# Altium footprint library adafruit.PCBLIB: 648 footprints (part 36 of 41)
Each footprint in its own frame and in the unit in brackets; x right, y up, seen from the top. Pads: shape width x height; smd on the part's side, far side on the other; paste and mask are expansions set on the pad; w line width, h text height; cw(c..) or ccw(c..) is an arc to the next point about the centre after c.
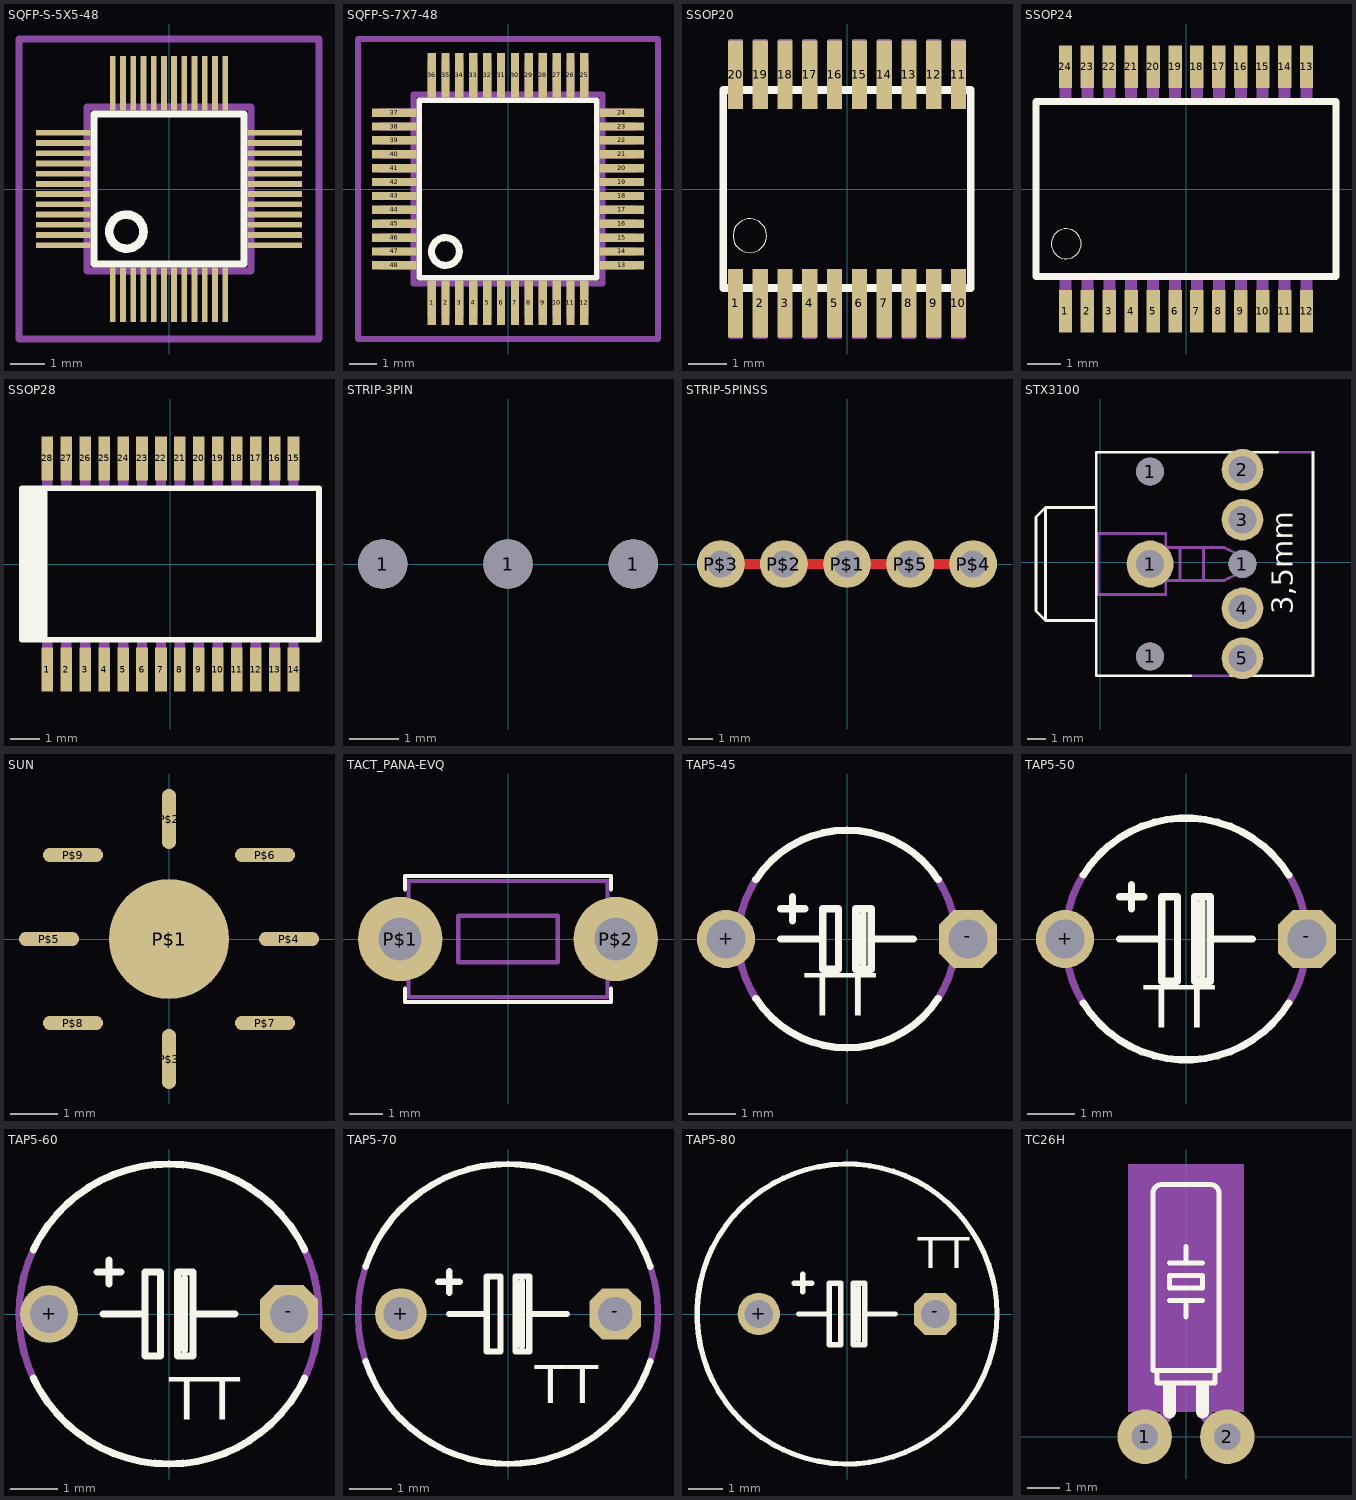
[diagram p35: the footprints below, top view; thin cyan lines are the x and y axes]

## SQFP-S-5X5-48 [mm]
pads (48):
  rect 0.17x1.6 smd: 1(-1.65,-3.1) 2(-1.35,-3.1) 3(-1.05,-3.1) 4(-0.75,-3.1) 5(-0.45,-3.1) 6(-0.15,-3.1) 7(0.15,-3.1) 8(0.45,-3.1) 9(0.75,-3.1) 10(1.05,-3.1) 11(1.35,-3.1) 12(1.65,-3.1) 25(1.65,3.1) 26(1.35,3.1) 27(1.05,3.1) 28(0.75,3.1) 29(0.45,3.1) 30(0.15,3.1) 31(-0.15,3.1) 32(-0.45,3.1) 33(-0.75,3.1) 34(-1.05,3.1) 35(-1.35,3.1) 36(-1.65,3.1)
  rect 1.6x0.17 smd: 13(3.1,-1.65) 14(3.1,-1.35) 15(3.1,-1.05) 16(3.1,-0.75) 17(3.1,-0.45) 18(3.1,-0.15) 19(3.1,0.15) 20(3.1,0.45) 21(3.1,0.75) 22(3.1,1.05) 23(3.1,1.35) 24(3.1,1.65) 37(-3.1,1.65) 38(-3.1,1.35) 39(-3.1,1.05) 40(-3.1,0.75) 41(-3.1,0.45) 42(-3.1,0.15) 43(-3.1,-0.15) 44(-3.1,-0.45) 45(-3.1,-0.75) 46(-3.1,-1.05) 47(-3.1,-1.35) 48(-3.1,-1.65)
Top Overlay:
  circle w0.254: c-1.25,-1.25 r0.5
  lines w0.203: -2.2,-2.2 -2.2,2.2 2.2,2.2 2.2,-2.2 -2.2,-2.2
Mechanical 16:
  rectangle: -3.6,-1.72 -2.45,-1.58
  rectangle: -3.6,-1.42 -2.45,-1.28
  rectangle: -3.6,-1.12 -2.45,-0.98
  rectangle: -3.6,-0.82 -2.45,-0.68
  rectangle: -3.6,-0.52 -2.45,-0.38
  rectangle: -3.6,-0.22 -2.45,-0.08
  rectangle: -3.6,0.08 -2.45,0.22
  rectangle: -3.6,0.38 -2.45,0.52
  rectangle: -3.6,0.68 -2.45,0.82
  rectangle: -3.6,0.98 -2.45,1.12
  rectangle: -3.6,1.28 -2.45,1.42
  rectangle: -3.6,1.58 -2.45,1.72
  rectangle: -1.72,2.45 -1.58,3.6
  rectangle: -1.42,2.45 -1.28,3.6
  rectangle: -1.12,2.45 -0.98,3.6
  rectangle: -0.82,2.45 -0.68,3.6
  rectangle: -0.52,2.45 -0.38,3.6
  rectangle: -0.22,2.45 -0.08,3.6
  rectangle: 0.08,2.45 0.22,3.6
  rectangle: 0.38,2.45 0.52,3.6
  rectangle: 0.68,2.45 0.82,3.6
  rectangle: 0.98,2.45 1.12,3.6
  rectangle: 1.28,2.45 1.42,3.6
  rectangle: 1.58,2.45 1.72,3.6
  rectangle: 2.45,1.58 3.6,1.72
  rectangle: 2.45,1.28 3.6,1.42
  rectangle: 2.45,0.98 3.6,1.12
  rectangle: 2.45,0.68 3.6,0.82
  rectangle: 2.45,0.38 3.6,0.52
  rectangle: 2.45,0.08 3.6,0.22
  rectangle: 2.45,-0.22 3.6,-0.08
  rectangle: 2.45,-0.52 3.6,-0.38
  rectangle: 2.45,-0.82 3.6,-0.68
  rectangle: 2.45,-1.12 3.6,-0.98
  rectangle: 2.45,-1.42 3.6,-1.28
  rectangle: 2.45,-1.72 3.6,-1.58
  rectangle: 1.58,-3.6 1.72,-2.45
  rectangle: 1.28,-3.6 1.42,-2.45
  rectangle: 0.98,-3.6 1.12,-2.45
  rectangle: 0.68,-3.6 0.82,-2.45
  rectangle: 0.38,-3.6 0.52,-2.45
  rectangle: 0.08,-3.6 0.22,-2.45
  rectangle: -0.22,-3.6 -0.08,-2.45
  rectangle: -0.52,-3.6 -0.38,-2.45
  rectangle: -0.82,-3.6 -0.68,-2.45
  rectangle: -1.12,-3.6 -0.98,-2.45
  rectangle: -1.42,-3.6 -1.28,-2.45
  rectangle: -1.72,-3.6 -1.58,-2.45
  lines w0.203: -2.4,-2.4 -2.4,2.4 2.4,2.4 2.4,-2.4 -2.4,-2.4
Mechanical 27:
  lines w0.2: -4.4,-4.4 4.4,-4.4 4.4,4.4 -4.4,4.4 -4.4,-4.4

## SQFP-S-7X7-48 [mil]
pads (48):
  rect 11.81x62.99 smd: 1(-108.27,-161.42) 2(-88.58,-161.42) 3(-68.9,-161.42) 4(-49.21,-161.42) 5(-29.53,-161.42) 6(-9.84,-161.42) 7(9.84,-161.42) 8(29.53,-161.42) 9(49.21,-161.42) 10(68.9,-161.42) 11(88.58,-161.42) 12(108.27,-161.42) 25(108.27,161.42) 26(88.58,161.42) 27(68.9,161.42) 28(49.21,161.42) 29(29.53,161.42) 30(9.84,161.42) 31(-9.84,161.42) 32(-29.53,161.42) 33(-49.21,161.42) 34(-68.9,161.42) 35(-88.58,161.42) 36(-108.27,161.42)
  rect 62.99x11.81 smd: 13(161.42,-108.27) 14(161.42,-88.58) 15(161.42,-68.9) 16(161.42,-49.21) 17(161.42,-29.53) 18(161.42,-9.84) 19(161.42,9.84) 20(161.42,29.53) 21(161.42,49.21) 22(161.42,68.9) 23(161.42,88.58) 24(161.42,108.27) 37(-161.42,108.27) 38(-161.42,88.58) 39(-161.42,68.9) 40(-161.42,49.21) 41(-161.42,29.53) 42(-161.42,9.84) 43(-161.42,-9.84) 44(-161.42,-29.53) 45(-161.42,-49.21) 46(-161.42,-68.9) 47(-161.42,-88.58) 48(-161.42,-108.27)
Top Overlay:
  circle w10: c-88.58,-88.58 r19.68
  lines w8: -125.98,-125.98 125.98,-125.98 125.98,125.98 -125.98,125.98 -125.98,-125.98
Mechanical 16:
  rectangle: -114.17,-181.1 -102.36,-135.83
  rectangle: -94.49,-181.1 -82.68,-135.83
  rectangle: -74.8,-181.1 -62.99,-135.83
  rectangle: -55.12,-181.1 -43.31,-135.83
  rectangle: -35.43,-181.1 -23.62,-135.83
  rectangle: -15.75,-181.1 -3.94,-135.83
  rectangle: 3.94,-181.1 15.75,-135.83
  rectangle: 23.62,-181.1 35.43,-135.83
  rectangle: 43.31,-181.1 55.12,-135.83
  rectangle: 62.99,-181.1 74.8,-135.83
  rectangle: 82.68,-181.1 94.49,-135.83
  rectangle: 102.36,-181.1 114.17,-135.83
  rectangle: 135.83,-114.17 181.1,-102.36
  rectangle: 135.83,-94.49 181.1,-82.68
  rectangle: 135.83,-74.8 181.1,-62.99
  rectangle: 135.83,-55.12 181.1,-43.31
  rectangle: 135.83,-35.43 181.1,-23.62
  rectangle: 135.83,-15.75 181.1,-3.94
  rectangle: 135.83,3.94 181.1,15.75
  rectangle: 135.83,23.62 181.1,35.43
  rectangle: 135.83,43.31 181.1,55.12
  rectangle: 135.83,62.99 181.1,74.8
  rectangle: 135.83,82.68 181.1,94.49
  rectangle: 135.83,102.36 181.1,114.17
  rectangle: 102.36,135.83 114.17,181.1
  rectangle: 82.68,135.83 94.49,181.1
  rectangle: 62.99,135.83 74.8,181.1
  rectangle: 43.31,135.83 55.12,181.1
  rectangle: 23.62,135.83 35.43,181.1
  rectangle: 3.94,135.83 15.75,181.1
  rectangle: -15.75,135.83 -3.94,181.1
  rectangle: -35.43,135.83 -23.62,181.1
  rectangle: -55.12,135.83 -43.31,181.1
  rectangle: -74.8,135.83 -62.99,181.1
  rectangle: -94.49,135.83 -82.68,181.1
  rectangle: -114.17,135.83 -102.36,181.1
  rectangle: -181.1,102.36 -135.83,114.17
  rectangle: -181.1,82.68 -135.83,94.49
  rectangle: -181.1,62.99 -135.83,74.8
  rectangle: -181.1,43.31 -135.83,55.12
  rectangle: -181.1,23.62 -135.83,35.43
  rectangle: -181.1,3.94 -135.83,15.75
  rectangle: -181.1,-15.75 -135.83,-3.94
  rectangle: -181.1,-35.43 -135.83,-23.62
  rectangle: -181.1,-55.12 -135.83,-43.31
  rectangle: -181.1,-74.8 -135.83,-62.99
  rectangle: -181.1,-94.49 -135.83,-82.68
  rectangle: -181.1,-114.17 -135.83,-102.36
  lines w8: -133.86,-133.86 133.86,-133.86 133.86,133.86 -133.86,133.86 -133.86,-133.86
Mechanical 27:
  lines w7.87: -212.6,-212.6 -212.6,212.6 212.6,212.6 212.6,-212.6 -212.6,-212.6

## SSOP20 [mm]
pads (20):
  rect 0.4x1.8 smd: 1(-2.925,-3) 2(-2.275,-3) 3(-1.625,-3) 4(-0.975,-3) 5(-0.325,-3) 6(0.325,-3) 7(0.975,-3) 8(1.625,-3) 9(2.275,-3) 10(2.925,-3) 11(2.925,3) 12(2.275,3) 13(1.625,3) 14(0.975,3) 15(0.325,3) 16(-0.325,3) 17(-0.975,3) 18(-1.625,3) 19(-2.275,3) 20(-2.925,3)
Top Overlay:
  circle w0: c-2.55,-1.225 r0.442
  lines w0.203: -3.25,-2.6 -3.25,2.6 3.25,2.6 3.25,-2.6 -3.25,-2.6
Mechanical 16:
  rectangle: -3.103,2.642 -2.747,3.937
  rectangle: -2.453,2.642 -2.097,3.937
  rectangle: -1.803,2.642 -1.447,3.937
  rectangle: -1.153,2.642 -0.797,3.937
  rectangle: -0.503,2.642 -0.147,3.937
  rectangle: 0.147,2.642 0.503,3.937
  rectangle: 0.797,2.642 1.153,3.937
  rectangle: 1.447,2.642 1.803,3.937
  rectangle: 2.097,2.642 2.453,3.937
  rectangle: 2.747,2.642 3.103,3.937
  rectangle: 2.747,-3.937 3.103,-2.642
  rectangle: 2.097,-3.937 2.453,-2.642
  rectangle: 1.447,-3.937 1.803,-2.642
  rectangle: 0.797,-3.937 1.153,-2.642
  rectangle: 0.147,-3.937 0.503,-2.642
  rectangle: -0.503,-3.937 -0.147,-2.642
  rectangle: -1.153,-3.937 -0.797,-2.642
  rectangle: -1.803,-3.937 -1.447,-2.642
  rectangle: -2.453,-3.937 -2.097,-2.642
  rectangle: -3.103,-3.937 -2.747,-2.642

## SSOP24 [mil]
pads (24):
  rect 15.75x49.21 smd: 1(-140.75,-142.72) 2(-115.16,-142.72) 3(-89.57,-142.72) 4(-63.98,-142.72) 5(-38.39,-142.72) 6(-12.8,-142.72) 7(12.8,-142.72) 8(38.39,-142.72) 9(63.98,-142.72) 10(89.57,-142.72) 11(115.16,-142.72) 12(140.75,-142.72) 13(140.75,142.72) 14(115.16,142.72) 15(89.57,142.72) 16(63.98,142.72) 17(38.39,142.72) 18(12.8,142.72) 19(-12.8,142.72) 20(-38.39,142.72) 21(-63.98,142.72) 22(-89.57,142.72) 23(-115.16,142.72) 24(-140.75,142.72)
Top Overlay:
  circle w0: c-139.76,-63.98 r17.41
  lines w8: -175.2,-102.36 175.2,-102.36 175.2,102.36 -175.2,102.36 -175.2,-102.36
Mechanical 16:
  rectangle: -147.75,-155 -133.75,-104
  rectangle: -122.16,-155 -108.16,-104
  rectangle: -96.57,-155 -82.57,-104
  rectangle: -70.98,-155 -56.98,-104
  rectangle: -45.39,-155 -31.39,-104
  rectangle: -19.8,-155 -5.8,-104
  rectangle: 5.79,-155 19.79,-104
  rectangle: 31.39,-155 45.39,-104
  rectangle: 56.98,-155 70.98,-104
  rectangle: 82.57,-155 96.57,-104
  rectangle: 108.16,-155 122.16,-104
  rectangle: 133.75,-155 147.75,-104
  rectangle: 133.75,104 147.75,155
  rectangle: 108.16,104 122.16,155
  rectangle: 82.57,104 96.57,155
  rectangle: 56.98,104 70.98,155
  rectangle: 31.39,104 45.39,155
  rectangle: 5.79,104 19.79,155
  rectangle: -19.8,104 -5.8,155
  rectangle: -45.39,104 -31.39,155
  rectangle: -70.98,104 -56.98,155
  rectangle: -96.57,104 -82.57,155
  rectangle: -122.16,104 -108.16,155
  rectangle: -147.75,104 -133.75,155

## SSOP28 [mil]
pads (28):
  rect 15.75x59.06 smd: 1(-166.34,-142.72) 2(-140.75,-142.72) 3(-115.16,-142.72) 4(-89.57,-142.72) 5(-63.98,-142.72) 6(-38.39,-142.72) 7(-12.8,-142.72) 8(12.8,-142.72) 9(38.39,-142.72) 10(63.98,-142.72) 11(89.57,-142.72) 12(115.16,-142.72) 13(140.75,-142.72) 14(166.34,-142.72) 15(166.34,142.72) 16(140.75,142.72) 17(115.16,142.72) 18(89.57,142.72) 19(63.98,142.72) 20(38.39,142.72) 21(12.8,142.72) 22(-12.8,142.72) 23(-38.39,142.72) 24(-63.98,142.72) 25(-89.57,142.72) 26(-115.16,142.72) 27(-140.75,142.72) 28(-166.34,142.72)
Top Overlay:
  rectangle: -204.72,-102.36 -166.34,102.36
  lines w8: -200.79,-102.36 200.79,-102.36 200.79,102.36 -200.79,102.36
Mechanical 16:
  rectangle: -173.34,-155 -159.34,-104
  rectangle: -147.75,-155 -133.75,-104
  rectangle: -122.16,-155 -108.16,-104
  rectangle: -96.57,-155 -82.57,-104
  rectangle: -70.98,-155 -56.98,-104
  rectangle: -45.39,-155 -31.39,-104
  rectangle: -19.8,-155 -5.8,-104
  rectangle: 5.8,-155 19.8,-104
  rectangle: 31.39,-155 45.39,-104
  rectangle: 56.98,-155 70.98,-104
  rectangle: 82.57,-155 96.57,-104
  rectangle: 108.16,-155 122.16,-104
  rectangle: 133.75,-155 147.75,-104
  rectangle: 159.34,-155 173.34,-104
  rectangle: 159.34,104 173.34,155
  rectangle: 133.75,104 147.75,155
  rectangle: 108.16,104 122.16,155
  rectangle: 82.57,104 96.57,155
  rectangle: 56.98,104 70.98,155
  rectangle: 31.39,104 45.39,155
  rectangle: 5.8,104 19.8,155
  rectangle: -19.8,104 -5.8,155
  rectangle: -45.39,104 -31.39,155
  rectangle: -70.98,104 -56.98,155
  rectangle: -96.57,104 -82.57,155
  rectangle: -122.16,104 -108.16,155
  rectangle: -147.75,104 -133.75,155
  rectangle: -173.34,104 -159.34,155

## STRIP-3PIN [mm]
pads (3):
  round 1 hole 1: 1(-2.54,0) 1(0,0) 1(2.54,0)
Top Layer:
  region: 0,0 0.254,0 0.254,0.254 0,0.254

## STRIP-5PINSS [mil]
pads (5):
  round 76 hole 43.31: P$1(0,0) P$2(-100,0) P$3(-200,0) P$4(200,0) P$5(100,0)
Top Layer:
  lines w16: -200,0 200,0

## STX3100 [mm]
pads (8):
  round 1.5 hole 1.5: 1(2.7,-5.1) 1(2.7,4.9) 1(7.7,-0.1)
  round 2.54 hole 1.5: 1(2.7,-0.1)
  round 2.25 hole 1.5: 2(7.7,5) 3(7.7,2.3) 4(7.7,-2.5) 5(7.7,-5.2)
Top Overlay:
  lines w0.152: 4.906,-6.142 -0.212,-6.142 -0.212,-3.148 ; 7.065,-6.142 11.512,-6.142 11.512,5.942 11.51,5.942 ; 9.605,5.942 -0.212,5.942 -0.212,2.948 ; -2.96,-3.148 -0.212,-3.148 ; -2.96,-3.148 -3.468,-2.64 -3.468,2.44 -2.96,2.948 ; -2.96,-3.148 -2.96,2.948 ; -2.96,2.948 -0.212,2.948 ; -0.212,-3.148 -0.212,2.948
  text "3,5mm" at 10.79,-2.831 h1.97
Mechanical 16:
  lines w0.152: 4.806,-6.142 6.965,-6.142 ; 9.605,5.942 11.51,5.942 ; 3.552,-0.989 3.552,0.789 ; 3.552,-0.989 3.552,-1.751 -0.131,-1.751 -0.131,1.551 3.552,1.551 3.552,0.789 ; 3.552,-0.989 4.314,-0.989 ; 3.552,0.789 4.314,0.789 ; 4.314,-0.989 5.584,-0.989 ; 4.314,-0.989 4.314,0.789 ; 4.314,0.789 5.584,0.789 ; 5.584,-0.989 5.584,0.789 ; 5.584,-0.989 6.727,-0.989 7.489,-0.608 7.489,0.408 6.727,0.789 5.584,0.789

## SUN [mil]
pads (9):
  rrect100% 100x100 smd: P$1(0,0)
  rrect100% 12x50 smd: P$2(0,100) P$3(0,-100)
  rrect100% 50x12 smd: P$4(100,0) P$5(-100,0) P$6(80,70) P$7(80,-70) P$8(-80,-70) P$9(-80,70)

## TACT_PANA-EVQ [mil]
pads (2):
  round 100 hole 51.18: P$1(-127.95,0) P$2(127.95,0)
Top Overlay:
  lines w5: -122.05,-59.06 -122.05,-74.8 122.05,-74.8 122.05,-59.06 ; -122.05,59.06 -122.05,74.8 122.05,74.8 122.05,59.06
Mechanical 16:
  lines w5: -118.11,-19.69 -118.11,-68.9 118.11,-68.9 118.11,-19.69 ; -118.11,-19.69 -118.11,19.69 ; -118.11,-19.69 -118.11,19.69 ; -118.11,-19.69 -155.51,-19.69 -155.51,0 -155.51,19.69 -118.11,19.69 ; -118.11,19.69 -118.11,68.9 118.11,68.9 118.11,19.69 ; 118.11,-19.69 118.11,19.69 ; 118.11,-19.69 118.11,19.69 ; 118.11,-19.69 155.51,-19.69 155.51,19.69 ; 118.11,19.69 155.51,19.69 ; 118.11,19.69 155.51,19.69 ; -59.06,-27.56 59.06,-27.56 59.06,27.56 -59.06,27.56 -59.06,-27.56

## TAP5-45 [mil]
pads (2):
  round 48 hole 32: +(-100,0)
  oct 48x48 hole 32: -(100,0)
Top Overlay:
  lines w6: -75.37,-49.18 ccw(c0,0) 75.37,-49.18 ; -75.37,49.18 cw(c0,0) 75.37,49.18 ; -55,0 -20,0 ; -55,25 -35,25 ; -45,15 -45,35 ; 13,-20 13,20 ; 55,0 20,0 ; -20,0 -20,-25 -7,-25 -7,25 -20,25 -20,0 ; 20,0 20,-25 7,-25 7,25 20,25 20,0
  text "TT" at -35,-75 h60.45
Mechanical 16:
  lines w6: -75.37,-49.18 cw(c0,0) -75.37,49.18 ; 75.37,-49.18 ccw(c0,0) 75.37,49.18

## TAP5-50 [mil]
pads (2):
  round 48 hole 32: +(-100,0)
  oct 48x48 hole 32: -(100,0)
Top Overlay:
  lines w6: -84.87,-52.88 ccw(c0,0) 84.87,-52.88 ; -84.87,52.88 cw(c0,0) 84.87,52.88 ; -55,0 -20,0 ; -55,35 -35,35 ; -45,25 -45,45 ; 13,-30 13,30 ; 55,0 20,0 ; -20,0 -20,-35 -7,-35 -7,35 -20,35 -20,0 ; 20,0 20,-35 7,-35 7,35 20,35 20,0
  text "TT" at -35,-85 h60.45
Mechanical 16:
  lines w6: -84.87,-52.88 cw(c0,0) -84.87,52.88 ; 84.87,-52.88 ccw(c0,0) 84.87,52.88

## TAP5-60 [mil]
pads (2):
  round 48 hole 32: +(-100,0)
  oct 48x48 hole 32: -(100,0)
Top Overlay:
  lines w6: -113,-53.44 ccw(c0,0) 113,-53.44 ; -113,53.44 cw(c0,0) 113,53.44 ; -60,35 -40,35 ; -55,0 -20,0 ; -50,25 -50,45 ; 13,-30 13,30 ; 55,0 20,0 ; -20,0 -20,-35 -7,-35 -7,35 -20,35 -20,0 ; 20,0 20,-35 7,-35 7,35 20,35 20,0
  text "TT" at 0,-100 h60.45
Mechanical 16:
  lines w6: -113,-53.44 cw(c0,0) -113,53.44 ; 113,-53.44 ccw(c0,0) 113,53.44

## TAP5-70 [mil]
pads (2):
  round 48 hole 32: +(-100,0)
  oct 48x48 hole 32: -(100,0)
Top Overlay:
  lines w6: -132.87,-44.09 ccw(c0,0) 132.87,-44.09 ; -132.87,44.09 cw(c0,0) 132.87,44.09 ; -65,30 -45,30 ; -55,0 -20,0 ; -55,20 -55,40 ; 13,-30 13,30 ; 55,0 20,0 ; -20,0 -20,-35 -7,-35 -7,35 -20,35 -20,0 ; 20,0 20,-35 7,-35 7,35 20,35 20,0
  text "TT" at 25,-95 h60.45
Mechanical 16:
  lines w6: -132.87,-44.09 cw(c0,0) -132.87,44.09 ; 132.87,-44.09 ccw(c0,0) 132.87,44.09

## TAP5-80 [mil]
pads (2):
  round 48 hole 32: +(-100,0)
  oct 48x48 hole 32: -(100,0)
Top Overlay:
  circle w6: c0,0 r170
  lines w6: -60,35 -40,35 ; -55,0 -20,0 ; -50,25 -50,45 ; 13,-30 13,30 ; 55,0 20,0 ; -20,0 -20,35 -7,35 -7,-35 -20,-35 -20,0 ; 20,0 20,35 7,35 7,-35 20,-35 20,0
  text "TT" at 80,40 h60.45

## TC26H [mil]
pads (2):
  round 66 hole 32: 1(-50,0) 2(50,0)
Top Overlay:
  rectangle: 12,40 28,63
  rectangle: -28,40 -12,63
  lines w6: -20,165 0,165 ; -20,210 0,210 ; 0,145 0,165 ; 0,230 0,210 ; 20,165 0,165 ; 20,210 0,210 ; -35,80 -35,65 35,65 35,80 ; -35,80 -40,80 -40,295 cw(c-30,295) -30,305 30,305 cw(c30,295) 40,295 40,80 35,80 ; -35,80 35,80 ; -20,180 -20,195 20,195 20,180 -20,180
  lines w16: -20,30 -20,50 ; 20,30 20,45
Mechanical 10:
  rectangle: -70,30 70,330
Mechanical 16:
  lines w16: -50,0 -25,25 ; 25,25 50,0